# Altium integrated library Rosenberger FAKRA.IntLib: 102 symbols (continued)
## 59S2AQ-40MT5-M
designator P?
FaKrA Right Angle Plug, Edge Mount Pin in Paste, Coding M (Pastel-orange), In Line, Up to 6 GHz, -40 to 105 degC; PartNumber: 59S2AQ-40MT5-M; Coding: M (Pastel Orange); Design Note: Footprint in library is a generic example - only application specific footprint delivers High Performance; DatasheetVersion: c00; PackageVersion: c00; PackageReference: 59S2AQ-40MT5-M; PackageDescription: FaKrA Right Angle Plug, Pin in Paste, 22.65 x 8.5 x 3.8 mm; Mounting Technology: Pin-in-Paste; ComponentLink1Description: Manufacturer URL; ComponentLink1URL: http://www.rosenberger.de; ComponentLink2Description: Datasheet; ComponentLink2URL: http://rosenberger.de/ok/images/documents/db/59S2AQ-40MT5-Y.pdf; ComponentLink3Description: Package Specification; ComponentLink3URL: http://rosenberger.de/ok/images/documents/db/59S2AQ-40MT5-Y.pdf; ComponentLink4Description: Series Overview / Design Note; ComponentLink4URL: http://rosenberger.de/ok/images/documents/spez/59fakra.pdf; ComponentLink5Description: Webshop / RFQ; ComponentLink5URL: http://www.rosenberger.com/en/contact/sales/
footprint ROS-59S2AQ-40MT5-M_V (FaKrA Right Angle Plug, Pin in Paste, 22.65x8.5x3.8mm, Rosenberger Recommended)
pins: 1, MH

## 59S2AQ-40MT5-Z
designator P?
FaKrA Right Angle Plug, Edge Mount Pin in Paste, Coding Z (Waterblue), In Line, Up to 6 GHz, -40 to 105 degC; PartNumber: 59S2AQ-40MT5-Z; Design Note: Footprint in library is a generic example - only application specific footprint delivers High Performance; DatasheetVersion: c00; PackageVersion: c00; PackageReference: 59S2AQ-40MT5-Z; PackageDescription: FaKrA Right Angle Plug, Pin in Paste, 22.65 x 8.5 x 3.8 mm; Coding: Z (Waterblue); Mounting Technology: Pin-in-Paste; ComponentLink1Description: Manufacturer URL; ComponentLink1URL: http://www.rosenberger.de; ComponentLink2Description: Datasheet; ComponentLink2URL: http://rosenberger.de/ok/images/documents/db/59S2AQ-40MT5-Y.pdf; ComponentLink3Description: Package Specification; ComponentLink3URL: http://rosenberger.de/ok/images/documents/db/59S2AQ-40MT5-Y.pdf; ComponentLink4Description: Series Overview / Design Note; ComponentLink4URL: http://rosenberger.de/ok/images/documents/spez/59fakra.pdf; ComponentLink5Description: Webshop / RFQ; ComponentLink5URL: http://www.rosenberger.com/en/contact/sales/
footprint ROS-59S2AQ-40MT5-Z_V (FaKrA Right Angle Plug, Pin in Paste, 22.65x8.5x3.8mm, Rosenberger Recommended)
pins: 1, MH

## 59S2DA-40MT5-A
designator P?
Dual FaKrA Right Angle Plug, Edge Mount Pin in Paste, Coding A (Black), In Line, Up to 6 GHz, -40 to 105 degC; PartNumber: 59S2DA-40MT5-A; Design Note: Footprint in library is a generic example - only application specific footprint delivers High Performance; DatasheetVersion: c00; PackageVersion: c00; PackageReference: 59S2DA-40MT5-A; PackageDescription: Dual FaKrA Right Angle Plug, Edge Mount Pin in Paste, 23.45 x 15.5 x 3 mm; Coding: A (Black); Mounting Technology: Pin-in-Paste; ComponentLink1Description: Manufacturer URL; ComponentLink1URL: http://www.rosenberger.de; ComponentLink2Description: Datasheet; ComponentLink2URL: http://rosenberger.de/ok/images/documents/db/59S2DA-40MT5-Y.pdf; ComponentLink3Description: Package Specification; ComponentLink3URL: http://rosenberger.de/ok/images/documents/db/59S2DA-40MT5-Y.pdf; ComponentLink4Description: Series Overview / Design Note; ComponentLink4URL: http://rosenberger.de/ok/images/documents/spez/59fakra.pdf; ComponentLink5Description: Webshop / RFQ; ComponentLink5URL: http://www.rosenberger.com/en/contact/sales/
footprint ROS-59S2DA-40MT5-A_V (Dual FaKrA Right Angle Plug, Edge Mount Pin in Paste, 23.45x15.5x3mm, Rosenberger Recommended)
pins: 1, 2, MH

## 59S2DA-40MT5-B
designator P?
Dual FaKrA Right Angle Plug, Edge Mount Pin in Paste, Coding B (White), In Line, Up to 6 GHz, -40 to 105 degC; PartNumber: 59S2DA-40MT5-B; Design Note: Footprint in library is a generic example - only application specific footprint delivers High Performance; DatasheetVersion: c00; PackageVersion: c00; PackageReference: 59S2DA-40MT5-B; PackageDescription: Dual FaKrA Right Angle Plug, Edge Mount Pin in Paste, 23.45 x 15.5 x 3 mm; Coding: B (White); Mounting Technology: Pin-in-Paste; ComponentLink1Description: Manufacturer URL; ComponentLink1URL: http://www.rosenberger.de; ComponentLink2Description: Datasheet; ComponentLink2URL: http://rosenberger.de/ok/images/documents/db/59S2DA-40MT5-Y.pdf; ComponentLink3Description: Package Specification; ComponentLink3URL: http://rosenberger.de/ok/images/documents/db/59S2DA-40MT5-Y.pdf; ComponentLink4Description: Series Overview / Design Note; ComponentLink4URL: http://rosenberger.de/ok/images/documents/spez/59fakra.pdf; ComponentLink5Description: Webshop / RFQ; ComponentLink5URL: http://www.rosenberger.com/en/contact/sales/
footprint ROS-59S2DA-40MT5-B_V (Dual FaKrA Right Angle Plug, Edge Mount Pin in Paste, 23.45x15.5x3mm, Rosenberger Recommended)
pins: 1, 2, MH

## 59S2DA-40MT5-C
designator P?
Dual FaKrA Right Angle Plug, Edge Mount Pin in Paste, Coding C (Blue), In Line, Up to 6 GHz, -40 to 105 degC; PartNumber: 59S2DA-40MT5-C; Design Note: Footprint in library is a generic example - only application specific footprint delivers High Performance; DatasheetVersion: c00; PackageVersion: c00; PackageReference: 59S2DA-40MT5-C; PackageDescription: Dual FaKrA Right Angle Plug, Edge Mount Pin in Paste, 23.45 x 15.5 x 3 mm; Coding: C (Blue); Mounting Technology: Pin-in-Paste; ComponentLink1Description: Manufacturer URL; ComponentLink1URL: http://www.rosenberger.de; ComponentLink2Description: Datasheet; ComponentLink2URL: http://rosenberger.de/ok/images/documents/db/59S2DA-40MT5-Y.pdf; ComponentLink3Description: Package Specification; ComponentLink3URL: http://rosenberger.de/ok/images/documents/db/59S2DA-40MT5-Y.pdf; ComponentLink4Description: Series Overview / Design Note; ComponentLink4URL: http://rosenberger.de/ok/images/documents/spez/59fakra.pdf; ComponentLink5Description: Webshop / RFQ; ComponentLink5URL: http://www.rosenberger.com/en/contact/sales/
footprint ROS-59S2DA-40MT5-C_V (Dual FaKrA Right Angle Plug, Edge Mount Pin in Paste, 23.45x15.5x3mm, Rosenberger Recommended)
pins: 1, 2, MH

## 59S2DA-40MT5-D
designator P?
Dual FaKrA Right Angle Plug, Edge Mount Pin in Paste, Coding D (Bordeauxviolet), In Line, Up to 6 GHz, -40 to 105 degC; PartNumber: 59S2DA-40MT5-D; Design Note: Footprint in library is a generic example - only application specific footprint delivers High Performance; DatasheetVersion: c00; PackageVersion: c00; PackageReference: 59S2DA-40MT5-D; PackageDescription: Dual FaKrA Right Angle Plug, Edge Mount Pin in Paste, 23.45 x 15.5 x 3 mm; Coding: D (Bordeauxviolet); Mounting Technology: Pin-in-Paste; ComponentLink1Description: Manufacturer URL; ComponentLink1URL: http://www.rosenberger.de; ComponentLink2Description: Datasheet; ComponentLink2URL: http://rosenberger.de/ok/images/documents/db/59S2DA-40MT5-Y.pdf; ComponentLink3Description: Package Specification; ComponentLink3URL: http://rosenberger.de/ok/images/documents/db/59S2DA-40MT5-Y.pdf; ComponentLink4Description: Series Overview / Design Note; ComponentLink4URL: http://rosenberger.de/ok/images/documents/spez/59fakra.pdf; ComponentLink5Description: Webshop / RFQ; ComponentLink5URL: http://www.rosenberger.com/en/contact/sales/
footprint ROS-59S2DA-40MT5-D_V (Dual FaKrA Right Angle Plug, Edge Mount Pin in Paste, 23.45x15.5x3mm, Rosenberger Recommended)
pins: 1, 2, MH

## 59S2DA-40MT5-E
designator P?
Dual FaKrA Right Angle Plug, Edge Mount Pin in Paste, Coding E (Green), In Line, Up to 6 GHz, -40 to 105 degC; PartNumber: 59S2DA-40MT5-E; Design Note: Footprint in library is a generic example - only application specific footprint delivers High Performance; DatasheetVersion: c00; PackageVersion: c00; PackageReference: 59S2DA-40MT5-E; PackageDescription: Dual FaKrA Right Angle Plug, Edge Mount Pin in Paste, 23.45 x 15.5 x 3 mm; Coding: E (Green); Mounting Technology: Pin-in-Paste; ComponentLink1Description: Manufacturer URL; ComponentLink1URL: http://www.rosenberger.de; ComponentLink2Description: Datasheet; ComponentLink2URL: http://rosenberger.de/ok/images/documents/db/59S2DA-40MT5-Y.pdf; ComponentLink3Description: Package Specification; ComponentLink3URL: http://rosenberger.de/ok/images/documents/db/59S2DA-40MT5-Y.pdf; ComponentLink4Description: Series Overview / Design Note; ComponentLink4URL: http://rosenberger.de/ok/images/documents/spez/59fakra.pdf; ComponentLink5Description: Webshop / RFQ; ComponentLink5URL: http://www.rosenberger.com/en/contact/sales/
footprint ROS-59S2DA-40MT5-E_V (Dual FaKrA Right Angle Plug, Edge Mount Pin in Paste, 23.45x15.5x3mm, Rosenberger Recommended)
pins: 1, 2, MH

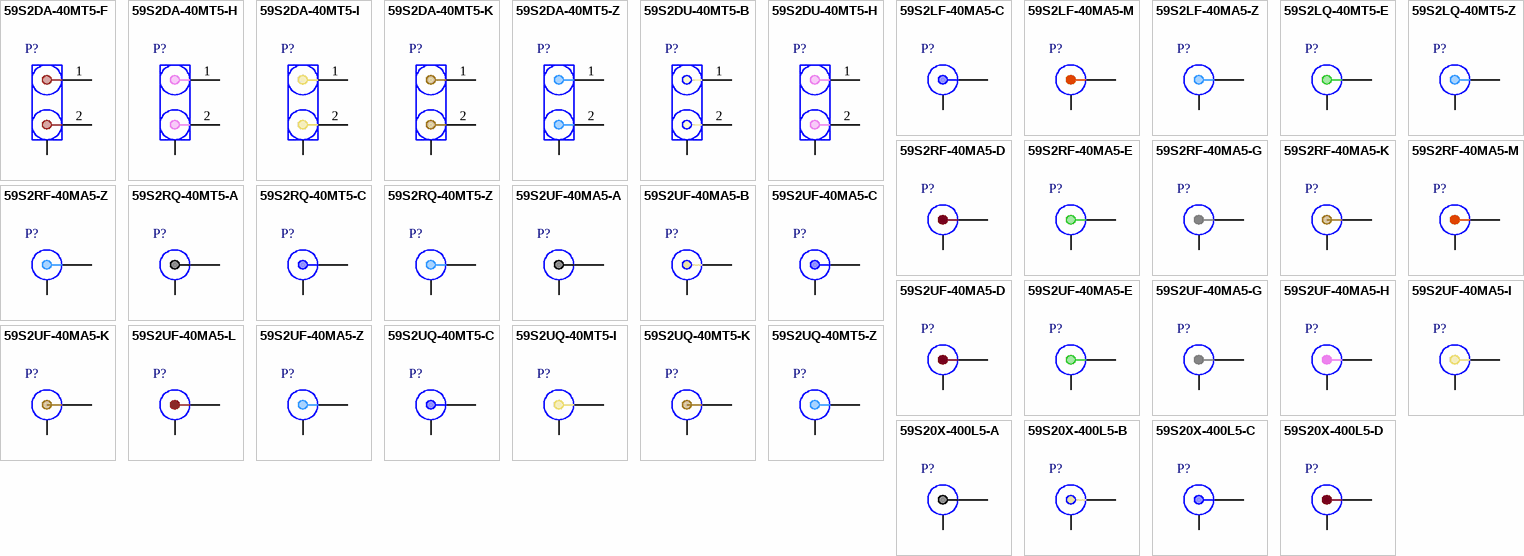
[diagram p1: symbols 59S2DA-40MT5-F to 59S20X-400L5-D]

## 59S2DA-40MT5-F
designator P?
Dual FaKrA Right Angle Plug, Edge Mount Pin in Paste, Coding F (Brown), In Line, Up to 6 GHz, -40 to 105 degC; PartNumber: 59S2DA-40MT5-F; Design Note: Footprint in library is a generic example - only application specific footprint delivers High Performance; DatasheetVersion: c00; PackageVersion: c00; PackageReference: 59S2DA-40MT5-F; PackageDescription: Dual FaKrA Right Angle Plug, Edge Mount Pin in Paste, 23.45 x 15.5 x 3 mm; Coding: F (Brown); Mounting Technology: Pin-in-Paste; ComponentLink1Description: Manufacturer URL; ComponentLink1URL: http://www.rosenberger.de; ComponentLink2Description: Datasheet; ComponentLink2URL: http://rosenberger.de/ok/images/documents/db/59S2DA-40MT5-Y.pdf; ComponentLink3Description: Package Specification; ComponentLink3URL: http://rosenberger.de/ok/images/documents/db/59S2DA-40MT5-Y.pdf; ComponentLink4Description: Series Overview / Design Note; ComponentLink4URL: http://rosenberger.de/ok/images/documents/spez/59fakra.pdf; ComponentLink5Description: Webshop / RFQ; ComponentLink5URL: http://www.rosenberger.com/en/contact/sales/
footprint ROS-59S2DA-40MT5-F_V (Dual FaKrA Right Angle Plug, Edge Mount Pin in Paste, 23.45x15.5x3mm, Rosenberger Recommended)
pins: 1, 2, MH

## 59S2DA-40MT5-H
designator P?
Dual FaKrA Right Angle Plug, Edge Mount Pin in Paste, Coding H (Violet), In Line, Up to 6 GHz, -40 to 105 degC; PartNumber: 59S2DA-40MT5-H; Design Note: Footprint in library is a generic example - only application specific footprint delivers High Performance; DatasheetVersion: c00; PackageVersion: c00; PackageReference: 59S2DA-40MT5-H; PackageDescription: Dual FaKrA Right Angle Plug, Edge Mount Pin in Paste, 23.45 x 15.5 x 3 mm; Coding: H (Violet); Mounting Technology: Pin-in-Paste; ComponentLink1Description: Manufacturer URL; ComponentLink1URL: http://www.rosenberger.de; ComponentLink2Description: Datasheet; ComponentLink2URL: http://rosenberger.de/ok/images/documents/db/59S2DA-40MT5-Y.pdf; ComponentLink3Description: Package Specification; ComponentLink3URL: http://rosenberger.de/ok/images/documents/db/59S2DA-40MT5-Y.pdf; ComponentLink4Description: Series Overview / Design Note; ComponentLink4URL: http://rosenberger.de/ok/images/documents/spez/59fakra.pdf; ComponentLink5Description: Webshop / RFQ; ComponentLink5URL: http://www.rosenberger.com/en/contact/sales/
footprint ROS-59S2DA-40MT5-H_V (Dual FaKrA Right Angle Plug, Edge Mount Pin in Paste, 23.45x15.5x3mm, Rosenberger Recommended)
pins: 1, 2, MH

## 59S2DA-40MT5-I
designator P?
Dual FaKrA Right Angle Plug, Edge Mount Pin in Paste, Coding I (Beige), In Line, Up to 6 GHz, -40 to 105 degC; PartNumber: 59S2DA-40MT5-I; Design Note: Footprint in library is a generic example - only application specific footprint delivers High Performance; DatasheetVersion: c00; PackageVersion: c00; PackageReference: 59S2DA-40MT5-I; PackageDescription: Dual FaKrA Right Angle Plug, Edge Mount Pin in Paste, 23.45 x 15.5 x 3 mm; Coding: I (Beige); Mounting Technology: Pin-in-Paste; ComponentLink1Description: Manufacturer URL; ComponentLink1URL: http://www.rosenberger.de; ComponentLink2Description: Datasheet; ComponentLink2URL: http://rosenberger.de/ok/images/documents/db/59S2DA-40MT5-Y.pdf; ComponentLink3Description: Package Specification; ComponentLink3URL: http://rosenberger.de/ok/images/documents/db/59S2DA-40MT5-Y.pdf; ComponentLink4Description: Series Overview / Design Note; ComponentLink4URL: http://rosenberger.de/ok/images/documents/spez/59fakra.pdf; ComponentLink5Description: Webshop / RFQ; ComponentLink5URL: http://www.rosenberger.com/en/contact/sales/
footprint ROS-59S2DA-40MT5-I_V (Dual FaKrA Right Angle Plug, Edge Mount Pin in Paste, 23.45x15.5x3mm, Rosenberger Recommended)
pins: 1, 2, MH

## 59S2DA-40MT5-K
designator P?
Dual FaKrA Right Angle Plug, Edge Mount Pin in Paste, Coding K (Curry), In Line, Up to 6 GHz, -40 to 105 degC; PartNumber: 59S2DA-40MT5-K; Design Note: Footprint in library is a generic example - only application specific footprint delivers High Performance; DatasheetVersion: c00; PackageVersion: c00; PackageReference: 59S2DA-40MT5-K; PackageDescription: Dual FaKrA Right Angle Plug, Edge Mount Pin in Paste, 23.45 x 15.5 x 3 mm; Coding: K (Curry); Mounting Technology: Pin-in-Paste; ComponentLink1Description: Manufacturer URL; ComponentLink1URL: http://www.rosenberger.de; ComponentLink2Description: Datasheet; ComponentLink2URL: http://rosenberger.de/ok/images/documents/db/59S2DA-40MT5-Y.pdf; ComponentLink3Description: Package Specification; ComponentLink3URL: http://rosenberger.de/ok/images/documents/db/59S2DA-40MT5-Y.pdf; ComponentLink4Description: Series Overview / Design Note; ComponentLink4URL: http://rosenberger.de/ok/images/documents/spez/59fakra.pdf; ComponentLink5Description: Webshop / RFQ; ComponentLink5URL: http://www.rosenberger.com/en/contact/sales/
footprint ROS-59S2DA-40MT5-K_V (Dual FaKrA Right Angle Plug, Edge Mount Pin in Paste, 23.45x15.5x3mm, Rosenberger Recommended)
pins: 1, 2, MH

## 59S2DA-40MT5-Z
designator P?
Dual FaKrA Right Angle Plug, Edge Mount Pin in Paste, Coding Z (Waterblue), In Line, Up to 6 GHz, -40 to 105 degC; PartNumber: 59S2DA-40MT5-Z; Design Note: Footprint in library is a generic example - only application specific footprint delivers High Performance; DatasheetVersion: c00; PackageVersion: c00; PackageReference: 59S2DA-40MT5-Z; PackageDescription: Dual FaKrA Right Angle Plug, Edge Mount Pin in Paste, 23.45 x 15.5 x 3 mm; Coding: Z (Waterblue); Mounting Technology: Pin-in-Paste; ComponentLink1Description: Manufacturer URL; ComponentLink1URL: http://www.rosenberger.de; ComponentLink2Description: Datasheet; ComponentLink2URL: http://rosenberger.de/ok/images/documents/db/59S2DA-40MT5-Y.pdf; ComponentLink3Description: Package Specification; ComponentLink3URL: http://rosenberger.de/ok/images/documents/db/59S2DA-40MT5-Y.pdf; ComponentLink4Description: Series Overview / Design Note; ComponentLink4URL: http://rosenberger.de/ok/images/documents/spez/59fakra.pdf; ComponentLink5Description: Webshop / RFQ; ComponentLink5URL: http://www.rosenberger.com/en/contact/sales/
footprint ROS-59S2DA-40MT5-Z_V (Dual FaKrA Right Angle Plug, Edge Mount Pin in Paste, 23.45x15.5x3mm, Rosenberger Recommended)
pins: 1, 2, MH

## 59S2DU-40MT5-B
designator P?
Dual FaKrA Right Angle Plug, Edge Mount Pin in Paste,  Upside Down, Coding B (White), In Line, Up to 6 GHz, -40 to 105 degC; PartNumber: 59S2DU-40MT5-B; Design Note: Footprint in library is a generic example - only application specific footprint delivers High Performance; DatasheetVersion: b00; PackageVersion: b00; PackageReference: 59S2DU-40MT5-B; PackageDescription: Dual FaKrA Right Angle Plug, Edge Mount Pin in Paste, 23.45 x 15.5 x 3 mm; Coding: B (White); Mounting Technology: Pin-in-Paste; ComponentLink1Description: Manufacturer URL; ComponentLink1URL: http://www.rosenberger.de; ComponentLink2Description: Datasheet; ComponentLink2URL: http://rosenberger.de/ok/images/documents/db/59S2DU-40MT5-Y.pdf; ComponentLink3Description: Package Specification; ComponentLink3URL: http://rosenberger.de/ok/images/documents/db/59S2DU-40MT5-Y.pdf; ComponentLink4Description: Series Overview / Design Note; ComponentLink4URL: http://rosenberger.de/ok/images/documents/spez/59fakra.pdf; ComponentLink5Description: Webshop / RFQ; ComponentLink5URL: http://www.rosenberger.com/en/contact/sales/
footprint ROS-59S2DU-40MT5-B_V (Dual FaKrA Right Angle Plug, Edge Mount Pin in Paste, 23.45x15.5x3mm, Rosenberger Recommended)
pins: 1, 2, MH

## 59S2DU-40MT5-H
designator P?
Dual FaKrA Right Angle Plug, Edge Mount Pin in Paste,  Upside Down, Coding H (Violet), In Line, Up to 6 GHz, -40 to 105 degC; PartNumber: 59S2DU-40MT5-H; Design Note: Footprint in library is a generic example - only application specific footprint delivers High Performance; DatasheetVersion: b00; PackageVersion: b00; PackageReference: 59S2DU-40MT5-H; PackageDescription: Dual FaKrA Right Angle Plug, Edge Mount Pin in Paste, 23.45 x 15.5 x 3 mm; Coding: H (Violet); Mounting Technology: Pin-in-Paste; ComponentLink1Description: Manufacturer URL; ComponentLink1URL: http://www.rosenberger.de; ComponentLink2Description: Datasheet; ComponentLink2URL: http://rosenberger.de/ok/images/documents/db/59S2DU-40MT5-Y.pdf; ComponentLink3Description: Package Specification; ComponentLink3URL: http://rosenberger.de/ok/images/documents/db/59S2DU-40MT5-Y.pdf; ComponentLink4Description: Series Overview / Design Note; ComponentLink4URL: http://rosenberger.de/ok/images/documents/spez/59fakra.pdf; ComponentLink5Description: Webshop / RFQ; ComponentLink5URL: http://www.rosenberger.com/en/contact/sales/
footprint ROS-59S2DU-40MT5-H_V (Dual FaKrA Right Angle Plug, Edge Mount Pin in Paste, 23.45x15.5x3mm, Rosenberger Recommended)
pins: 1, 2, MH

## 59S2LF-40MA5-C
designator P?
FaKrA Right Angle Plug, Edge Mount Pin in Paste, Laying, Coding D (Blue), Up to 6 GHz, -40 to 105 degC; PartNumber: 59S2LF-40MA5-C; Coding: C (Blue); Design Note: Footprint in library is a generic example - only application specific footprint delivers High Performance; DatasheetVersion: b00; PackageVersion: b00; PackageReference: 59S2LF-40MA5-C; PackageDescription: FaKrA Right Angle Plug, Edge Mount Pin in Paste, 23.1 x 10.9 x 5.45 mm; Mounting Technology: Pin-in-Paste; ComponentLink1Description: Manufacturer URL; ComponentLink1URL: http://www.rosenberger.de; ComponentLink2Description: Datasheet; ComponentLink2URL: http://rosenberger.de/ok/images/documents/db/59S2LF-40MA5-Y.pdf; ComponentLink3Description: Package Specification; ComponentLink3URL: http://rosenberger.de/ok/images/documents/db/59S2LF-40MA5-Y.pdf; ComponentLink4Description: Series Overview / Design Note; ComponentLink4URL: http://rosenberger.de/ok/images/documents/spez/59fakra.pdf; ComponentLink5Description: Webshop / RFQ; ComponentLink5URL: http://www.rosenberger.com/en/contact/sales/
footprint ROS-59S2LF-40MA5-C_V (FaKrA Right Angle Plug, Edge Mount Pin in Paste, 23.1x10.9x5.45mm, Rosenberger Recommended)
pins: 1, MH

## 59S2LF-40MA5-M
designator P?
FaKrA Right Angle Plug, Edge Mount Pin in Paste, Laying, Coding M (Pastel-Orange), Up to 6 GHz, -40 to 105 degC; PartNumber: 59S2LF-40MA5-M; Coding: M (Pastel Orange); Design Note: Footprint in library is a generic example - only application specific footprint delivers High Performance; DatasheetVersion: b00; PackageVersion: b00; PackageReference: 59S2LF-40MA5-M; PackageDescription: FaKrA Right Angle Plug, Edge Mount Pin in Paste, 23.1 x 10.9 x 5.45 mm; Mounting Technology: Pin-in-Paste; ComponentLink1Description: Manufacturer URL; ComponentLink1URL: http://www.rosenberger.de; ComponentLink2Description: Datasheet; ComponentLink2URL: http://rosenberger.de/ok/images/documents/db/59S2LF-40MA5-Y.pdf; ComponentLink3Description: Package Specification; ComponentLink3URL: http://rosenberger.de/ok/images/documents/db/59S2LF-40MA5-Y.pdf; ComponentLink4Description: Series Overview / Design Note; ComponentLink4URL: http://rosenberger.de/ok/images/documents/spez/59fakra.pdf; ComponentLink5Description: Webshop / RFQ; ComponentLink5URL: http://www.rosenberger.com/en/contact/sales/
footprint ROS-59S2LF-40MA5-M_V (FaKrA Right Angle Plug, Edge Mount Pin in Paste, 23.1x10.9x5.45mm, Rosenberger Recommended)
pins: 1, MH

## 59S2LF-40MA5-Z
designator P?
FaKrA Right Angle Plug, Edge Mount Pin in Paste, Laying, Coding Z (Waterblue), Up to 6 GHz, -40 to 105 degC; PartNumber: 59S2LF-40MA5-Z; Design Note: Footprint in library is a generic example - only application specific footprint delivers High Performance; DatasheetVersion: b00; PackageVersion: b00; PackageReference: 59S2LF-40MA5-Z; PackageDescription: FaKrA Right Angle Plug, Edge Mount Pin in Paste, 23.1 x 10.9 x 5.45 mm; Coding: Z (Waterblue); Mounting Technology: Pin-in-Paste; ComponentLink1Description: Manufacturer URL; ComponentLink1URL: http://www.rosenberger.de; ComponentLink2Description: Datasheet; ComponentLink2URL: http://rosenberger.de/ok/images/documents/db/59S2LF-40MA5-Y.pdf; ComponentLink3Description: Package Specification; ComponentLink3URL: http://rosenberger.de/ok/images/documents/db/59S2LF-40MA5-Y.pdf; ComponentLink4Description: Series Overview / Design Note; ComponentLink4URL: http://rosenberger.de/ok/images/documents/spez/59fakra.pdf; ComponentLink5Description: Webshop / RFQ; ComponentLink5URL: http://www.rosenberger.com/en/contact/sales/
footprint ROS-59S2LF-40MA5-Z_V (FaKrA Right Angle Plug, Edge Mount Pin in Paste, 23.1x10.9x5.45mm, Rosenberger Recommended)
pins: 1, MH

## 59S2LQ-40MT5-E
designator P?
FaKrA Right Angle Plug, Edge Mount Pin in Paste, Llaying, Coding E (Green), Up to 6 GHz, -40 to 105 degC; PartNumber: 59S2LQ-40MT5-E; Design Note: Footprint in library is a generic example - only application specific footprint delivers High Performance; DatasheetVersion: c00; PackageVersion: c00; PackageReference: 59S2LQ-40MT5-E; PackageDescription: FaKra-HF Right Angle Plug, Edge Mount Pin in Paste, 10.5 x 22.65 x 3.8 mm; Coding: E (Green); Mounting Technology: Pin-in-Paste; ComponentLink1Description: Manufacturer URL; ComponentLink1URL: http://www.rosenberger.de; ComponentLink2Description: Datasheet; ComponentLink2URL: http://rosenberger.de/ok/images/documents/db/59S2LQ-40MT5-Y.pdf; ComponentLink3Description: Package Specification; ComponentLink3URL: http://rosenberger.de/ok/images/documents/db/59S2LQ-40MT5-Y.pdf; ComponentLink4Description: Series Overview / Design Note; ComponentLink4URL: http://rosenberger.de/ok/images/documents/spez/59fakra.pdf; ComponentLink5Description: Webshop / RFQ; ComponentLink5URL: http://www.rosenberger.com/en/contact/sales/
footprint ROS-59S2LQ-40MT5-E_V (FaKra-HF Right Angle Plug, Edge Mount Pin in Paste, 10.5x22.65x3.8mm, Rosenberger Recommended)
pins: 1, MH

## 59S2LQ-40MT5-Z
designator P?
FaKrA Right Angle Plug, Edge Mount Pin in Paste, Llaying, Coding Z (Waterblue), Up to 6 GHz, -40 to 105 degC; PartNumber: 59S2LQ-40MT5-Z; Coding: Z (Waterbule); Design Note: Footprint in library is a generic example - only application specific footprint delivers High Performance; DatasheetVersion: c00; PackageVersion: c00; PackageReference: 59S2LQ-40MT5-Z; PackageDescription: FaKra-HF Right Angle Plug, Edge Mount Pin in Paste, 10.5 x 22.65 x 3.8 mm; Mounting Technology: Pin-in-Paste; ComponentLink1Description: Manufacturer URL; ComponentLink1URL: http://www.rosenberger.de; ComponentLink2Description: Datasheet; ComponentLink2URL: http://rosenberger.de/ok/images/documents/db/59S2LQ-40MT5-Y.pdf; ComponentLink3Description: Package Specification; ComponentLink3URL: http://rosenberger.de/ok/images/documents/db/59S2LQ-40MT5-Y.pdf; ComponentLink4Description: Series Overview / Design Note; ComponentLink4URL: http://rosenberger.de/ok/images/documents/spez/59fakra.pdf; ComponentLink5Description: Webshop / RFQ; ComponentLink5URL: http://www.rosenberger.com/en/contact/sales/
footprint ROS-59S2LQ-40MT5-Z_V (FaKra-HF Right Angle Plug, Edge Mount Pin in Paste, 10.5x22.65x3.8mm, Rosenberger Recommended)
pins: 1, MH

## 59S2RF-40MA5-D
designator P?
FaKrA Right Angle Plug, Edge Mount Pin in Paste, Laying, Coding D (Bordeauxviolet), Up to 6 GHz, -40 to 105 degC; PartNumber: 59S2RF-40MA5-D; Design Note: Footprint in library is a generic example - only application specific footprint delivers High Performance; DatasheetVersion: b00; PackageVersion: b00; PackageReference: 59S2RF-40MA5-D; PackageDescription: FaKrA Right Angle Plug, Edge Mount Pin in Paste, 23.1 x 10.9 x 5.45 mm; Coding: D (Bordeauxviolet); Mounting Technology: Pin-in-Paste; ComponentLink1Description: Manufacturer URL; ComponentLink1URL: http://www.rosenberger.de; ComponentLink2Description: Datasheet; ComponentLink2URL: http://rosenberger.de/ok/images/documents/db/59S2RF-40MA5-Y.pdf; ComponentLink3Description: Package Specification; ComponentLink3URL: http://rosenberger.de/ok/images/documents/db/59S2RF-40MA5-Y.pdf; ComponentLink4Description: Series Overview / Design Note; ComponentLink4URL: http://rosenberger.de/ok/images/documents/spez/59fakra.pdf; ComponentLink5Description: Webshop / RFQ; ComponentLink5URL: http://www.rosenberger.com/en/contact/sales/
footprint ROS-59S2RF-40MA5-D_V (FaKrA Right Angle Plug, Edge Mount Pin in Paste, 23.1x10.9x5.45mm, Rosenberger Recommended)
pins: 1, MH

## 59S2RF-40MA5-E
designator P?
FaKrA Right Angle Plug, Edge Mount Pin in Paste, Laying, Coding E (Green), Up to 6 GHz, -40 to 105 degC; PartNumber: 59S2RF-40MA5-E; Design Note: Footprint in library is a generic example - only application specific footprint delivers High Performance; DatasheetVersion: b00; PackageVersion: b00; PackageReference: 59S2RF-40MA5-E; PackageDescription: FaKrA Right Angle Plug, Edge Mount Pin in Paste, 23.1 x 10.9 x 5.45 mm; Coding: E (Green); Mounting Technology: Pin-in-Paste; ComponentLink1Description: Manufacturer URL; ComponentLink1URL: http://www.rosenberger.de; ComponentLink2Description: Datasheet; ComponentLink2URL: http://rosenberger.de/ok/images/documents/db/59S2RF-40MA5-Y.pdf; ComponentLink3Description: Package Specification; ComponentLink3URL: http://rosenberger.de/ok/images/documents/db/59S2RF-40MA5-Y.pdf; ComponentLink4Description: Series Overview / Design Note; ComponentLink4URL: http://rosenberger.de/ok/images/documents/spez/59fakra.pdf; ComponentLink5Description: Webshop / RFQ; ComponentLink5URL: http://www.rosenberger.com/en/contact/sales/
footprint ROS-59S2RF-40MA5-E_V (FaKrA Right Angle Plug, Edge Mount Pin in Paste, 23.1x10.9x5.45mm, Rosenberger Recommended)
pins: 1, MH

## 59S2RF-40MA5-G
designator P?
FaKrA Right Angle Plug, Edge Mount Pin in Paste, Laying, Coding G (Grey), Up to 6 GHz, -40 to 105 degC; PartNumber: 59S2RF-40MA5-G; Design Note: Footprint in library is a generic example - only application specific footprint delivers High Performance; DatasheetVersion: b00; PackageVersion: b00; PackageReference: 59S2RF-40MA5-G; PackageDescription: FaKrA Right Angle Plug, Edge Mount Pin in Paste, 23.1 x 10.9 x 5.45 mm; Coding: G (Grey); Mounting Technology: Pin-in-Paste; ComponentLink1Description: Manufacturer URL; ComponentLink1URL: http://www.rosenberger.de; ComponentLink2Description: Datasheet; ComponentLink2URL: http://rosenberger.de/ok/images/documents/db/59S2RF-40MA5-Y.pdf; ComponentLink3Description: Package Specification; ComponentLink3URL: http://rosenberger.de/ok/images/documents/db/59S2RF-40MA5-Y.pdf; ComponentLink4Description: Series Overview / Design Note; ComponentLink4URL: http://rosenberger.de/ok/images/documents/spez/59fakra.pdf; ComponentLink5Description: Webshop / RFQ; ComponentLink5URL: http://www.rosenberger.com/en/contact/sales/
footprint ROS-59S2RF-40MA5-G_V (FaKrA Right Angle Plug, Edge Mount Pin in Paste, 23.1x10.9x5.45mm, Rosenberger Recommended)
pins: 1, MH

## 59S2RF-40MA5-K
designator P?
FaKrA Right Angle Plug, Edge Mount Pin in Paste, Laying, Coding K (Curry), Up to 6 GHz, -40 to 105 degC; PartNumber: 59S2RF-40MA5-K; Design Note: Footprint in library is a generic example - only application specific footprint delivers High Performance; DatasheetVersion: b00; PackageVersion: b00; PackageReference: 59S2RF-40MA5-K; PackageDescription: FaKrA Right Angle Plug, Edge Mount Pin in Paste, 23.1 x 10.9 x 5.45 mm; Coding: K (Curry); Mounting Technology: Pin-in-Paste; ComponentLink1Description: Manufacturer URL; ComponentLink1URL: http://www.rosenberger.de; ComponentLink2Description: Datasheet; ComponentLink2URL: http://rosenberger.de/ok/images/documents/db/59S2RF-40MA5-Y.pdf; ComponentLink3Description: Package Specification; ComponentLink3URL: http://rosenberger.de/ok/images/documents/db/59S2RF-40MA5-Y.pdf; ComponentLink4Description: Series Overview / Design Note; ComponentLink4URL: http://rosenberger.de/ok/images/documents/spez/59fakra.pdf; ComponentLink5Description: Webshop / RFQ; ComponentLink5URL: http://www.rosenberger.com/en/contact/sales/
footprint ROS-59S2RF-40MA5-K_V (FaKrA Right Angle Plug, Edge Mount Pin in Paste, 23.1x10.9x5.45mm, Rosenberger Recommended)
pins: 1, MH

## 59S2RF-40MA5-M
designator P?
FaKrA Right Angle Plug, Edge Mount Pin in Paste, Laying, Coding M (Pastel-Orange), Up to 6 GHz, -40 to 105 degC; PartNumber: 59S2RF-40MA5-M; Coding: M (Pastel Orange); Design Note: Footprint in library is a generic example - only application specific footprint delivers High Performance; DatasheetVersion: b00; PackageVersion: b00; PackageReference: 59S2RF-40MA5-M; PackageDescription: FaKrA Right Angle Plug, Edge Mount Pin in Paste, 23.1 x 10.9 x 5.45 mm; Mounting Technology: Pin-in-Paste; ComponentLink1Description: Manufacturer URL; ComponentLink1URL: http://www.rosenberger.de; ComponentLink2Description: Datasheet; ComponentLink2URL: http://rosenberger.de/ok/images/documents/db/59S2RF-40MA5-Y.pdf; ComponentLink3Description: Package Specification; ComponentLink3URL: http://rosenberger.de/ok/images/documents/db/59S2RF-40MA5-Y.pdf; ComponentLink4Description: Series Overview / Design Note; ComponentLink4URL: http://rosenberger.de/ok/images/documents/spez/59fakra.pdf; ComponentLink5Description: Webshop / RFQ; ComponentLink5URL: http://www.rosenberger.com/en/contact/sales/
footprint ROS-59S2RF-40MA5-M_V (FaKrA Right Angle Plug, Edge Mount Pin in Paste, 23.1x10.9x5.45mm, Rosenberger Recommended)
pins: 1, MH

## 59S2RF-40MA5-Z
designator P?
FaKrA Right Angle Plug, Edge Mount Pin in Paste, Laying, Coding Z (Waterblue), Up to 6 GHz, -40 to 105 degC; PartNumber: 59S2RF-40MA5-Z; Design Note: Footprint in library is a generic example - only application specific footprint delivers High Performance; DatasheetVersion: b00; PackageVersion: b00; PackageReference: 59S2RF-40MA5-Z; PackageDescription: FaKrA Right Angle Plug, Edge Mount Pin in Paste, 23.1 x 10.9 x 5.45 mm; Coding: Z (Waterblue); Mounting Technology: Pin-in-Paste; ComponentLink1Description: Manufacturer URL; ComponentLink1URL: http://www.rosenberger.de; ComponentLink2Description: Datasheet; ComponentLink2URL: http://rosenberger.de/ok/images/documents/db/59S2RF-40MA5-Y.pdf; ComponentLink3Description: Package Specification; ComponentLink3URL: http://rosenberger.de/ok/images/documents/db/59S2RF-40MA5-Y.pdf; ComponentLink4Description: Series Overview / Design Note; ComponentLink4URL: http://rosenberger.de/ok/images/documents/spez/59fakra.pdf; ComponentLink5Description: Webshop / RFQ; ComponentLink5URL: http://www.rosenberger.com/en/contact/sales/
footprint ROS-59S2RF-40MA5-Z_V (FaKrA Right Angle Plug, Edge Mount Pin in Paste, 23.1x10.9x5.45mm, Rosenberger Recommended)
pins: 1, MH

## 59S2RQ-40MT5-A
designator P?
FaKrA Right Angle Plug, Edge Mount Pin in Paste, Laying, Coding A (Black), Up to 6 GHz, -40 to 105 degC; PartNumber: 59S2RQ-40MT5-A; Design Note: Footprint in library is a generic example - only application specific footprint delivers High Performance; DatasheetVersion: b00; PackageVersion: b00; PackageReference: 59S2RQ-40MT5-A; PackageDescription: FaKra-HF Right Angle Plug, Edge Mount Pin in Paste, 10.5 x 22.65 x 3.8 mm; Coding: A (Black); Mounting Technology: Pin-in-Paste; ComponentLink1Description: Manufacturer URL; ComponentLink1URL: http://www.rosenberger.de; ComponentLink2Description: Datasheet; ComponentLink2URL: http://rosenberger.de/ok/images/documents/db/59S2RQ-40MT5-Y.pdf; ComponentLink3Description: Package Specification; ComponentLink3URL: http://rosenberger.de/ok/images/documents/db/59S2RQ-40MT5-Y.pdf; ComponentLink4Description: Series Overview / Design Note; ComponentLink4URL: http://rosenberger.de/ok/images/documents/spez/59fakra.pdf; ComponentLink5Description: Webshop / RFQ; ComponentLink5URL: http://www.rosenberger.com/en/contact/sales/
footprint ROS-59S2RQ-40MT5-A_V (FaKra-HF Right Angle Plug, Edge Mount Pin in Paste, 10.5x22.65x3.8mm, Rosenberger Recommended)
pins: 1, MH

## 59S2RQ-40MT5-C
designator P?
FaKrA Right Angle Plug, Edge Mount Pin in Paste, Laying, Coding C (Blue), Up to 6 GHz, -40 to 105 degC; PartNumber: 59S2RQ-40MT5-C; Design Note: Footprint in library is a generic example - only application specific footprint delivers High Performance; DatasheetVersion: b00; PackageVersion: b00; PackageReference: 59S2RQ-40MT5-C; PackageDescription: FaKra-HF Right Angle Plug, Edge Mount Pin in Paste, 10.5 x 22.65 x 3.8 mm; Coding: C (Blue); Mounting Technology: Pin-in-Paste; ComponentLink1Description: Manufacturer URL; ComponentLink1URL: http://www.rosenberger.de; ComponentLink2Description: Datasheet; ComponentLink2URL: http://rosenberger.de/ok/images/documents/db/59S2RQ-40MT5-Y.pdf; ComponentLink3Description: Package Specification; ComponentLink3URL: http://rosenberger.de/ok/images/documents/db/59S2RQ-40MT5-Y.pdf; ComponentLink4Description: Series Overview / Design Note; ComponentLink4URL: http://rosenberger.de/ok/images/documents/spez/59fakra.pdf; ComponentLink5Description: Webshop / RFQ; ComponentLink5URL: http://www.rosenberger.com/en/contact/sales/
footprint ROS-59S2RQ-40MT5-C_V (FaKra-HF Right Angle Plug, Edge Mount Pin in Paste, 10.5x22.65x3.8mm, Rosenberger Recommended)
pins: 1, MH

## 59S2RQ-40MT5-Z
designator P?
FaKrA Right Angle Plug, Edge Mount Pin in Paste, Laying, Coding Z (Waterblue), Up to 6 GHz, -40 to 105 degC; PartNumber: 59S2RQ-40MT5-Z; Coding: Z (Waterbule); Design Note: Footprint in library is a generic example - only application specific footprint delivers High Performance; DatasheetVersion: b00; PackageVersion: b00; PackageReference: 59S2RQ-40MT5-Z; PackageDescription: FaKra-HF Right Angle Plug, Edge Mount Pin in Paste, 10.5 x 22.65 x 3.8 mm; Mounting Technology: Pin-in-Paste; ComponentLink1Description: Manufacturer URL; ComponentLink1URL: http://www.rosenberger.de; ComponentLink2Description: Datasheet; ComponentLink2URL: http://rosenberger.de/ok/images/documents/db/59S2RQ-40MT5-Y.pdf; ComponentLink3Description: Package Specification; ComponentLink3URL: http://rosenberger.de/ok/images/documents/db/59S2RQ-40MT5-Y.pdf; ComponentLink4Description: Series Overview / Design Note; ComponentLink4URL: http://rosenberger.de/ok/images/documents/spez/59fakra.pdf; ComponentLink5Description: Webshop / RFQ; ComponentLink5URL: http://www.rosenberger.com/en/contact/sales/
footprint ROS-59S2RQ-40MT5-Z_V (FaKra-HF Right Angle Plug, Edge Mount Pin in Paste, 10.5x22.65x3.8mm, Rosenberger Recommended)
pins: 1, MH

## 59S2UF-40MA5-A
designator P?
FaKrA Right Angle Plug, Edge Mount Pin in Paste, Upside Down, Coding A (Black), Up to 6 GHz, -40 to 105 degC; PartNumber: 59S2UF-40MA5-A; Design Note: Footprint in library is a generic example - only application specific footprint delivers High Performance; DatasheetVersion: b00; PackageVersion: b00; PackageReference: 59S2UF-40MA5-A; PackageDescription: FaKra-HF Right Angle Plug, Edge Mount Pin in Paste, 23.1 x 9.3 x 5.45 mm; Coding: A (Black); Mounting Technology: Pin-in-Paste; ComponentLink1Description: Manufacturer URL; ComponentLink1URL: http://www.rosenberger.de; ComponentLink2Description: Datasheet; ComponentLink2URL: http://rosenberger.de/ok/images/documents/db/59S2UF-40MA5-Y.pdf; ComponentLink3Description: Package Specification; ComponentLink3URL: http://rosenberger.de/ok/images/documents/db/59S2UF-40MA5-Y.pdf; ComponentLink4Description: Series Overview / Design Note; ComponentLink4URL: http://rosenberger.de/ok/images/documents/spez/59fakra.pdf; ComponentLink5Description: Webshop / RFQ; ComponentLink5URL: http://www.rosenberger.com/en/contact/sales/
footprint ROS-59S2UF-40MA5-A_V (FaKra-HF Right Angle Plug, Edge Mount Pin in Paste, 23.1x9.3x5.45mm, Rosenberger Recommended)
pins: 1, MH

## 59S2UF-40MA5-B
designator P?
FaKrA Right Angle Plug, Edge Mount Pin in Paste, Upside Down, Coding B (White), Up to 6 GHz, -40 to 105 degC; PartNumber: 59S2UF-40MA5-B; Design Note: Footprint in library is a generic example - only application specific footprint delivers High Performance; DatasheetVersion: b00; PackageVersion: b00; PackageReference: 59S2UF-40MA5-B; PackageDescription: FaKra-HF Right Angle Plug, Edge Mount Pin in Paste, 23.1 x 9.3 x 5.45 mm; Coding: B (White); Mounting Technology: Pin-in-Paste; ComponentLink1Description: Manufacturer URL; ComponentLink1URL: http://www.rosenberger.de; ComponentLink2Description: Datasheet; ComponentLink2URL: http://rosenberger.de/ok/images/documents/db/59S2UF-40MA5-Y.pdf; ComponentLink3Description: Package Specification; ComponentLink3URL: http://rosenberger.de/ok/images/documents/db/59S2UF-40MA5-Y.pdf; ComponentLink4Description: Series Overview / Design Note; ComponentLink4URL: http://rosenberger.de/ok/images/documents/spez/59fakra.pdf; ComponentLink5Description: Webshop / RFQ; ComponentLink5URL: http://www.rosenberger.com/en/contact/sales/
footprint ROS-59S2UF-40MA5-B_V (FaKra-HF Right Angle Plug, Edge Mount Pin in Paste, 23.1x9.3x5.45mm, Rosenberger Recommended)
pins: 1, MH

## 59S2UF-40MA5-C
designator P?
FaKrA Right Angle Plug, Edge Mount Pin in Paste, Upside Down, Coding C (Blue), Up to 6 GHz, -40 to 105 degC; PartNumber: 59S2UF-40MA5-C; Design Note: Footprint in library is a generic example - only application specific footprint delivers High Performance; DatasheetVersion: b00; PackageVersion: b00; PackageReference: 59S2UF-40MA5-C; PackageDescription: FaKra-HF Right Angle Plug, Edge Mount Pin in Paste, 23.1 x 9.3 x 5.45 mm; Coding: C (Blue); Mounting Technology: Pin-in-Paste; ComponentLink1Description: Manufacturer URL; ComponentLink1URL: http://www.rosenberger.de; ComponentLink2Description: Datasheet; ComponentLink2URL: http://rosenberger.de/ok/images/documents/db/59S2UF-40MA5-Y.pdf; ComponentLink3Description: Package Specification; ComponentLink3URL: http://rosenberger.de/ok/images/documents/db/59S2UF-40MA5-Y.pdf; ComponentLink4Description: Series Overview / Design Note; ComponentLink4URL: http://rosenberger.de/ok/images/documents/spez/59fakra.pdf; ComponentLink5Description: Webshop / RFQ; ComponentLink5URL: http://www.rosenberger.com/en/contact/sales/
footprint ROS-59S2UF-40MA5-C_V (FaKra-HF Right Angle Plug, Edge Mount Pin in Paste, 23.1x9.3x5.45mm, Rosenberger Recommended)
pins: 1, MH

## 59S2UF-40MA5-D
designator P?
FaKrA Right Angle Plug, Edge Mount Pin in Paste, Upside Down, Coding D (Bordeauxviolet), Up to 6 GHz, -40 to 105 degC; PartNumber: 59S2UF-40MA5-D; Design Note: Footprint in library is a generic example - only application specific footprint delivers High Performance; DatasheetVersion: b00; PackageVersion: b00; PackageReference: 59S2UF-40MA5-D; PackageDescription: FaKra-HF Right Angle Plug, Edge Mount Pin in Paste, 23.1 x 9.3 x 5.45 mm; Coding: D (Bordeauxviolet); Mounting Technology: Pin-in-Paste; ComponentLink1Description: Manufacturer URL; ComponentLink1URL: http://www.rosenberger.de; ComponentLink2Description: Datasheet; ComponentLink2URL: http://rosenberger.de/ok/images/documents/db/59S2UF-40MA5-Y.pdf; ComponentLink3Description: Package Specification; ComponentLink3URL: http://rosenberger.de/ok/images/documents/db/59S2UF-40MA5-Y.pdf; ComponentLink4Description: Series Overview / Design Note; ComponentLink4URL: http://rosenberger.de/ok/images/documents/spez/59fakra.pdf; ComponentLink5Description: Webshop / RFQ; ComponentLink5URL: http://www.rosenberger.com/en/contact/sales/
footprint ROS-59S2UF-40MA5-D_V (FaKra-HF Right Angle Plug, Edge Mount Pin in Paste, 23.1x9.3x5.45mm, Rosenberger Recommended)
pins: 1, MH

## 59S2UF-40MA5-E
designator P?
FaKrA Right Angle Plug, Edge Mount Pin in Paste, Upside Down, Coding E (Green), Up to 6 GHz, -40 to 105 degC; PartNumber: 59S2UF-40MA5-E; Design Note: Footprint in library is a generic example - only application specific footprint delivers High Performance; DatasheetVersion: b00; PackageVersion: b00; PackageReference: 59S2UF-40MA5-E; PackageDescription: FaKra-HF Right Angle Plug, Edge Mount Pin in Paste, 23.1 x 9.3 x 5.45 mm; Coding: E (Green); Mounting Technology: Pin-in-Paste; ComponentLink1Description: Manufacturer URL; ComponentLink1URL: http://www.rosenberger.de; ComponentLink2Description: Datasheet; ComponentLink2URL: http://rosenberger.de/ok/images/documents/db/59S2UF-40MA5-Y.pdf; ComponentLink3Description: Package Specification; ComponentLink3URL: http://rosenberger.de/ok/images/documents/db/59S2UF-40MA5-Y.pdf; ComponentLink4Description: Series Overview / Design Note; ComponentLink4URL: http://rosenberger.de/ok/images/documents/spez/59fakra.pdf; ComponentLink5Description: Webshop / RFQ; ComponentLink5URL: http://www.rosenberger.com/en/contact/sales/
footprint ROS-59S2UF-40MA5-E_V (FaKra-HF Right Angle Plug, Edge Mount Pin in Paste, 23.1x9.3x5.45mm, Rosenberger Recommended)
pins: 1, MH
